# Altium footprint library Emirhan's.PcbLib: 51 footprints (part 4 of 4)
Each footprint in its own frame and in the unit in brackets; x right, y up, seen from the top. Pads: shape width x height; smd on the part's side, far side on the other; paste and mask are expansions set on the pad; w line width, h text height; cw(c..) or ccw(c..) is an arc to the next point about the centre after c.
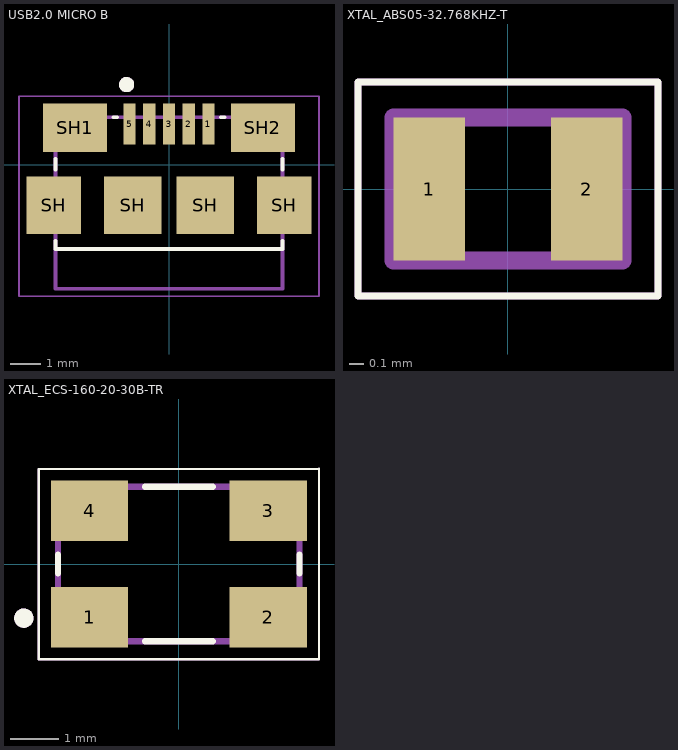
[diagram p3: the footprints below, top view; thin cyan lines are the x and y axes]

## USB2.0 MICRO B [mm]
pads (11):
  rect 0.4x1.35 smd: 1(1.3,1.338) 2(0.65,1.338) 3(0,1.338) 4(-0.65,1.338) 5(-1.3,1.338)
  rect 1.8x1.9 smd: SH(-3.8,-1.338) SH(3.8,-1.338)
  rect 1.9x1.9 smd: SH(-1.2,-1.338) SH(1.2,-1.338)
  rect 2.1x1.6 smd: SH1(-3.1,1.212) SH2(3.1,1.212)
Top Overlay:
  circle w0.3: c-1.4,2.638 r0.1
  lines w0.127: -3.75,-2.512 -3.75,-2.788 3.75,-2.788 3.75,-2.512 ; -3.75,-0.162 -3.75,0.188 ; -1.83,1.563 -1.72,1.563 ; 1.72,1.563 1.83,1.563 ; 3.75,-0.162 3.75,0.188
Top 3D Body:
  lines w0.127: -3.75,-2.788 3.75,-2.788 ; -3.75,-2.788 -3.75,-4.098 3.75,-4.098 3.75,-2.788 ; -3.75,-2.788 -3.75,1.563 3.75,1.563 3.75,-2.788
Top Designator:
  lines w0.05: -4.95,-4.349 -4.95,2.262 4.95,2.262 4.95,-4.349 -4.95,-4.349
  text ".Designator" at -2.3,-3.796 h0.8
Mechanical 13:
  circle w0.3: c-1.4,2.638 r0.1
3D body "step_temp.STEP": height 2.5, standoff -0.29, extent -3.955,-4.059 3.955,1.607

## XTAL_ABS05-32.768KHZ-T [mm]
height 0.5
pads (2):
  rect 0.5x1 smd: 1(-0.55,0) 2(0.55,0)
Top Overlay:
  lines w0.05: -1.05,-0.75 1.05,-0.75 1.05,0.75 -1.05,0.75 -1.05,-0.75
Top 3D Body:
  lines w0.05: -1.05,-0.75 1.05,-0.75 1.05,0.75 -1.05,0.75 -1.05,-0.75
Top Designator:
  lines w0.05: -1.05,-0.75 -1.05,0.75 1.05,0.75 1.05,-0.75 -1.05,-0.75
  text ".Designator" at 0.167,-0.3 h0.4
Mechanical 13:
  lines w0.127: -0.8,-0.5 0.8,-0.5 0.8,0.5 -0.8,0.5 -0.8,-0.5
3D body "ABS05-32.768KHZ-T--3DModel-STEP-400430.STEP": height 0.5, standoff 0, extent -0.8,-0.5 0.8,0.5

## XTAL_ECS-160-20-30B-TR [mm]
pads (4):
  rect 1.6x1.25 smd: 1(-1.85,-1.1) 2(1.85,-1.1) 3(1.85,1.1) 4(-1.85,1.1)
Top Overlay:
  circle w0.2: c-3.21,-1.12 r0.1
  lines w0.05: -2.9,-1.975 2.9,-1.975 2.9,1.975 -2.9,1.96 -2.9,-1.975
  lines w0.127: -2.5,-0.2 -2.5,0.2 ; -0.7,-1.6 0.7,-1.6 ; -0.7,1.6 0.7,1.6 ; 2.5,-0.2 2.5,0.2
Top 3D Body:
  lines w0.05: -2.9,-1.975 2.9,-1.975 2.9,1.975 -2.9,1.96 -2.9,-1.975
  lines w0.127: -2.5,-1.6 2.5,-1.6 2.5,1.6 -2.5,1.6 -2.5,-1.6
Top Designator:
  lines w0.05: -2.9,-1.975 -2.9,1.96 2.9,1.975 2.9,-1.975 -2.9,-1.975
  text ".Designator" at -0.9,-0.167 h0.4
Mechanical 13:
  circle w0.2: c-3.21,-1.12 r0.1
3D body "ECS-160-20-30B-TR.STEP": height 0.85, standoff 0, extent -2.5,-1.6 2.5,1.6